# Altium integrated library PWM_Controllers.IntLib: 5 symbols
Pins are listed as number, name and electrical type; pins without a type are passive.

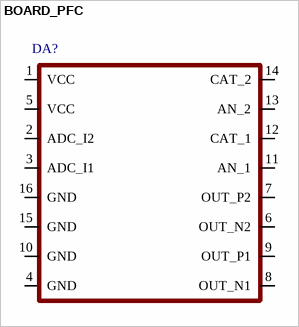
[diagram p0: symbol BOARD_PFC]

## BOARD_PFC
designator DA?
footprint BOARD_PFC
pins: 1 VCC, 2 ADC_I2, 3 ADC_I1, 4 GND, 5 VCC, 6 OUT_N2, 7 OUT_P2, 8 OUT_N1, 9 OUT_P1, 10 GND, 11 AN_1, 12 CAT_1, 13 AN_2, 14 CAT_2, 15 GND, 16 GND


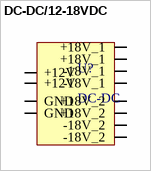
[diagram p1: symbol DC-DC/12-18VDC]

## DC-DC/12-18VDC
designator U?, comment DC-DC
footprint DC-DC_Bridge
pins: 1 +18V_1, 2 +18V_1, 3 -18V_1, 4 -18V_1, 8 +12V, 9 +12V, 10 GND, 11 GND, 15 -18V_2, 16 -18V_2, 17 +18V_2, 18 +18V_2


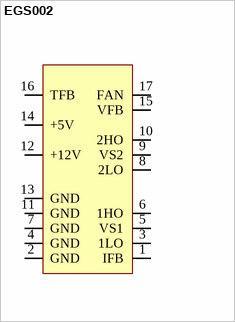
[diagram p2: symbol EGS002]

## EGS002
designator U?
EGS002  PWM
footprint EGS002
pins: 1 IFB, 2 GND, 3 1LO, 4 GND, 5 VS1, 6 1HO, 7 GND, 8 2LO, 9 VS2, 10 2HO, 11 GND, 12 +12V, 13 GND, 14 +5V, 15 VFB, 16 TFB, 17 FAN


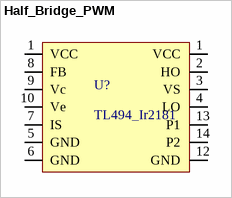
[diagram p3: symbol Half_Bridge_PWM]

## Half_Bridge_PWM
designator U?, comment TL494_Ir2181
footprint PWM_Controller_Half
pins: 1 VCC, 1 VCC, 2 HO, 3 VS, 4 LO, 5 GND, 6 GND, 7 IS, 8 FB, 9 Vc, 10 Ve, 12 GND, 13 P1, 14 P2


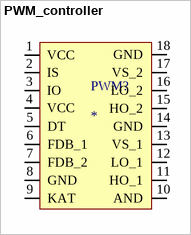
[diagram p4: symbol PWM_controller]

## PWM_controller
designator PWM?
PWM_controller
footprint PWM_controller
pins: 1 VCC, 2 IS, 3 IO, 4 VCC, 5 DT, 6 FDB_1, 7 FDB_2, 8 GND, 9 KAT, 10 AND, 11 HO_1, 12 LO_1, 13 VS_1, 14 GND, 15 HO_2, 16 LO_2, 17 VS_2, 18 GND